# Altium footprint library AD_Connectors.PcbLib: 130 footprints (part 6 of 9)
Each footprint in its own frame and in the unit in brackets; x right, y up, seen from the top. Pads: shape width x height; smd on the part's side, far side on the other; paste and mask are expansions set on the pad; w line width, h text height; cw(c..) or ccw(c..) is an arc to the next point about the centre after c.
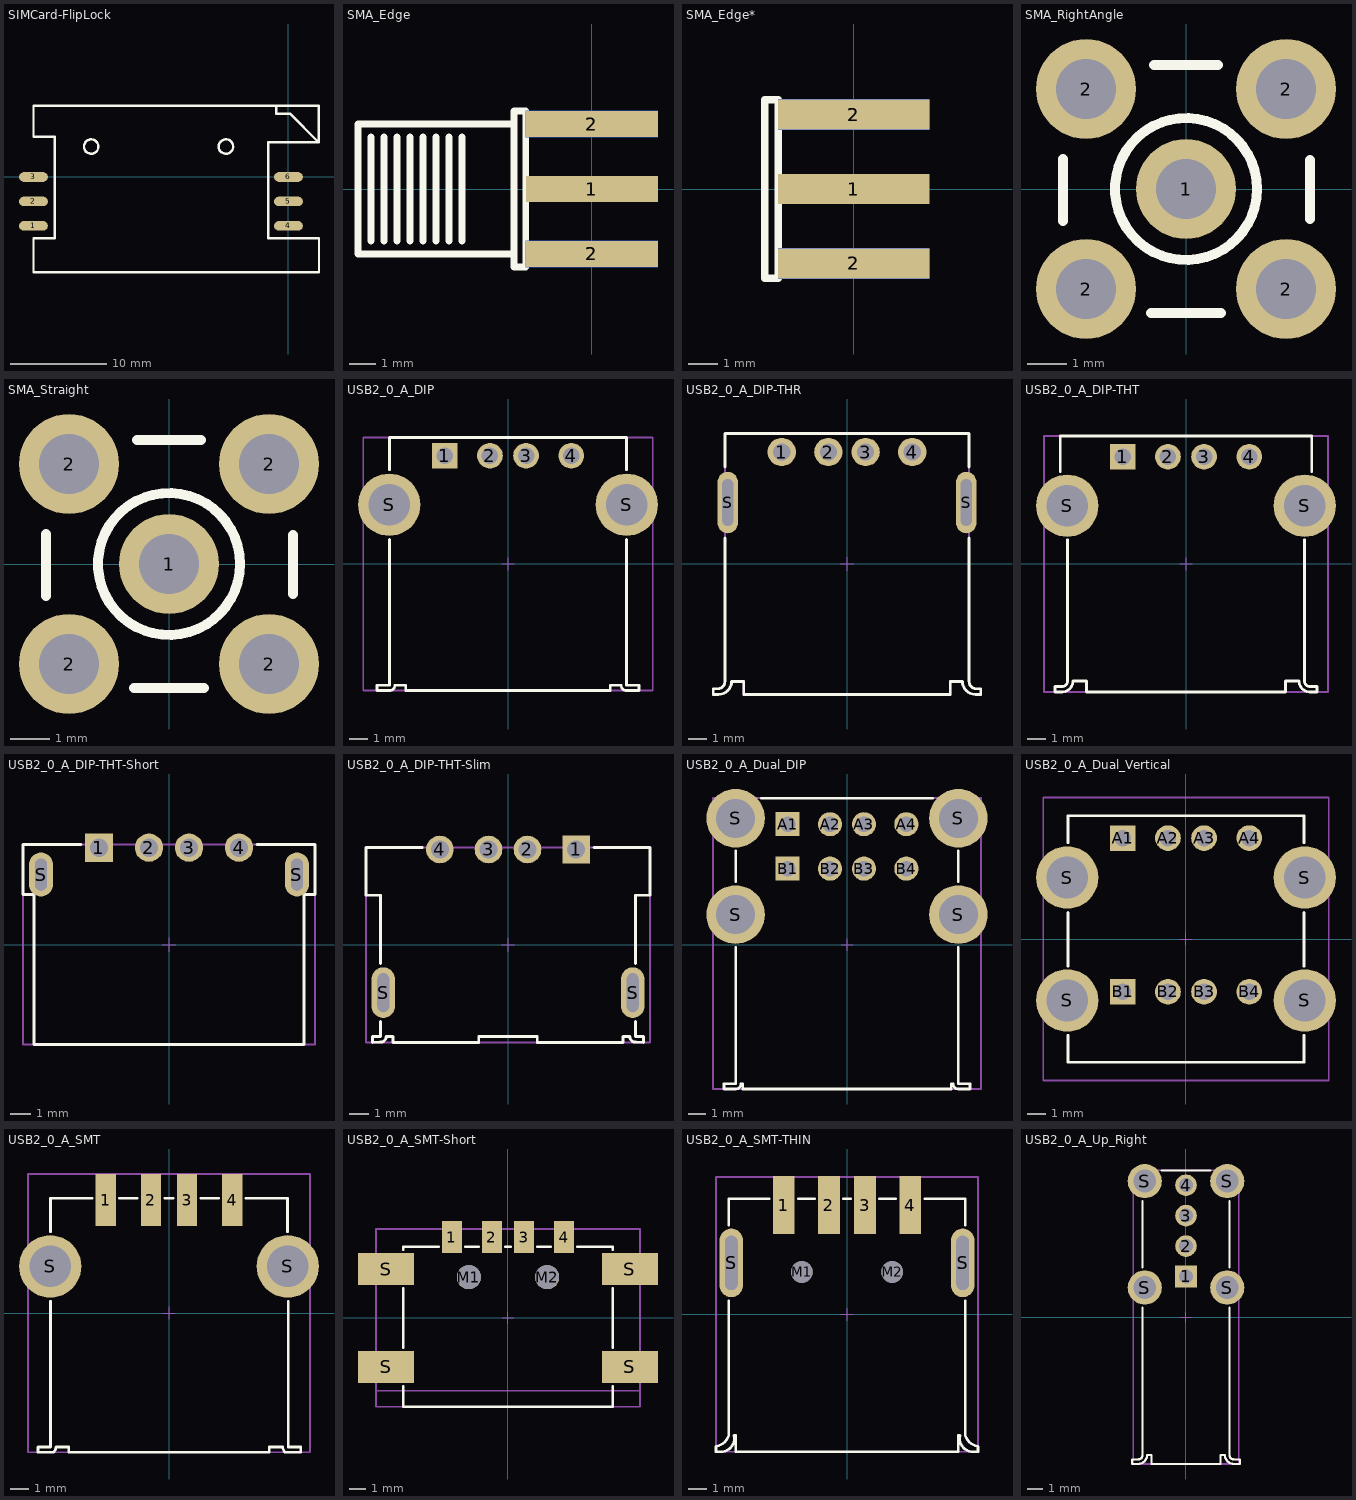
[diagram p5: the footprints below, top view; thin cyan lines are the x and y axes]

## SIMCard-FlipLock [mm]
height 2
pads (6):
  oval 3x1 smd: 1(-26.5,-5.08) 2(-26.5,-2.54) 3(-26.5,0) 4(0,-5.08) 5(0,-2.54) 6(0,0)
Top Overlay:
  circle w0.254: c-6.5,3.16 r0.75
  circle w0.254: c-20.5,3.16 r0.75
  lines w0.254: -26.492,7.366 -26.492,4.16 -24.282,4.16 -24.282,-6.39 -26.492,-6.39 -26.492,-9.89 3.175,-9.89 3.175,-6.39 -2.083,-6.39 -2.083,3.591 3.15,3.591 ; -26.492,7.391 -2.601,7.391 3.15,7.391 3.15,3.591 ; -1.25,7.391 -1.25,6.591 0.15,6.591 3.15,3.591
3D body "User Library-SIM5060-6-0-26-01-A.STEP": height 2.6, standoff -0.7, extent -26.48,-9.85 3.16,7.35

## SMA_Edge [mil] "SMA PCB Edge Mount"
pads (5):
  rect 200x40 smd: 1(0,0) 2(0,-98.43) 2(0,98.43)
  rect 200x40 smd far side: 2(0,-98.43) 2(0,98.43)
Top Overlay:
  lines w10: -334.65,-78.74 -334.65,78.74 ; -314.96,-78.74 -314.96,78.74 ; -295.28,-78.74 -295.28,78.74 ; -275.59,-78.74 -275.59,78.74 ; -255.91,-78.74 -255.91,78.74 ; -236.22,-78.74 -236.22,78.74 ; -216.54,-78.74 -216.54,-59.06 -216.54,78.74 ; -196.85,-78.74 -196.85,78.74 ; -118.11,-98.43 -354.33,-98.43 -354.33,98.43 -118.11,98.43 ; -118.11,-118.11 -100,-118.11 -100,118.11 -118.11,118.11 -118.11,-118.11
3D body "SMA PCB edge Mount.step": height 137.8, standoff -100.39, extent -477.95,-118.23 57.49,117.99

## SMA_Edge* [mil] "SMA PCB Edge Mount"
pads (5):
  rect 200x40 smd: 1(0,0) 2(0,-98.43) 2(0,98.43)
  rect 200x40 smd far side: 2(0,-98.43) 2(0,98.43)
Top Overlay:
  lines w10: -118.11,-118.11 -118.11,118.11 -100,118.11 -100,-118.11 -118.11,-118.11
3D body "SMA PCB edge Mount.step": height 137.8, standoff -100.39, extent -477.95,-118.23 57.49,117.99

## SMA_RightAngle [mil] "SMA PCB Mount Right Angle"
height 314.96
pads (5):
  round 100 hole 60: 1(0,0) 2(-100,-100) 2(-100,100) 2(100,-100) 2(100,100)
Top Overlay:
  circle w10: c0,0 r71
  lines w10: -123,-32 -123,30 ; -35,-124 35,-124 ; -32,124 32,124 ; 124,-30 124,29
3D body "Samtec-SMA-J-P-H-RA-TH1.STEP": height 403.94, standoff -151.37, extent -456.71,-137.79 137.78,137.8

## SMA_Straight [mil] "SMA PCB Mount Straight"
pads (5):
  round 100 hole 60: 1(0,0) 2(-100,-100) 2(-100,100) 2(100,-100) 2(100,100)
Top Overlay:
  circle w10: c0,0 r71
  lines w10: -123,-32 -123,30 ; -35,-124 35,-124 ; -32,124 32,124 ; 124,-30 124,29
3D body "3-1478979-0.stp": height 400, standoff -111.81, extent -124.99,-124.99 125,125

## USB2_0_A_DIP [mm] "USB 2.0 Type A Horizontal"
height 6.9
pads (6):
  rect 1.42x1.42 hole 0.92: 1(-3.5,5.99)
  round 1.42 hole 0.92: 2(-1,5.99) 3(1,5.99) 4(3.5,5.99)
  round 3.45 hole 2.3: S(-6.57,3.28) S(6.57,3.28)
Top Overlay:
  lines w0.15: -6.55,1.35 -6.55,-6.7 -7.25,-6.7 -7.25,-7 -6.56,-7 ccw(c-6.55,-6.7) -6.25,-6.7 -5.65,-6.7 -5.65,-7 5.65,-7 5.65,-6.7 6.25,-6.7 ccw(c6.55,-6.7) 6.56,-7 7.25,-7 7.25,-6.7 6.55,-6.7 6.55,1.35 ; -6.55,5.21 -6.55,7 6.55,7 6.55,5.21
Mechanical 1:
  text "PCB Thickness 1.6mm" at -3.15,-7.7 h0.76
Mechanical 13:
  lines w0.1: -8,-7 -8,7 8,7 8,-7 -8,-7
Mechanical 15:
  lines w0.05: -0.35,0 0.35,0 ; 0,-0.35 0,0.35
3D body "61400416021.stp": height 7.63, standoff -4.06, extent -7.999,-7 7.999,7

## USB2_0_A_DIP-THR [mm] "USB Type A Horizontal THR"
height 7.25
pads (6):
  round 1.52 hole 0.92: 1(-3.5,6.01) 2(-1,6.01) 3(1,6.01) 4(3.5,6.01)
  oval 1.1x3.3 hole 0.6 slot 2.5 at 90 deg: S(-6.4,3.3) S(6.4,3.3)
Top Overlay:
  lines w0.15: -6.972,-6.7 -7.175,-6.7 -7.175,-7 -6.895,-7 ccw(c-6.895,-6.3) -6.195,-6.3 -5.545,-6.3 -5.545,-7 5.545,-7 5.545,-6.3 6.195,-6.3 ccw(c6.895,-6.3) 6.895,-7 7.175,-7 7.175,-6.7 6.972,-6.7 ; -6.972,-6.699 ccw(c-6.95,-6.3) -6.55,-6.3 -6.55,1.4 ; -6.55,5.2 -6.55,7 6.55,7 6.55,5.2 ; 6.55,1.4 6.55,-6.3 ccw(c6.95,-6.3) 6.972,-6.699
Mechanical 13:
  lines w0.1: -6.972,-6.7 -7.175,-6.7 -7.175,-7 -6.895,-7 ccw(c-6.895,-6.3) -6.195,-6.3 -5.545,-6.3 -5.545,-7 5.545,-7 5.545,-6.3 6.195,-6.3 ccw(c6.895,-6.3) 6.895,-7 7.175,-7 7.175,-6.7 6.972,-6.7 ; -6.972,-6.699 ccw(c-6.95,-6.3) -6.55,-6.3 -6.55,7 6.55,7 6.55,-6.3 ccw(c6.95,-6.3) 6.972,-6.699
Mechanical 15:
  lines w0.05: -0.35,0 0.35,0 ; 0,-0.35 0,0.35
3D body "61410416021R.stp": height 7.5, standoff -2.19, extent -7.225,-7 7.225,7

## USB2_0_A_DIP-THT [mm] "USB 2.0 Type A Horizontal THT"
height 6.9
pads (6):
  rect 1.42x1.42 hole 0.92: 1(-3.5,5.935)
  round 1.42 hole 0.92: 2(-1,5.935) 3(1,5.935) 4(3.5,5.935)
  round 3.45 hole 2.3: S(-6.57,3.225) S(6.57,3.225)
Top Overlay:
  lines w0.15: -6.95,5.115 -6.95,7.075 6.95,7.075 6.95,5.115 ; -6.55,1.335 -6.55,-6.475 cw(c-6.85,-6.475) -6.85,-6.775 -7.25,-6.775 -7.25,-7.075 -6.85,-7.075 ccw(c-6.85,-6.475) -6.25,-6.475 -5.5,-6.475 -5.5,-7.075 5.5,-7.075 5.5,-6.475 6.25,-6.475 ccw(c6.85,-6.475) 6.85,-7.075 7.25,-7.075 7.25,-6.775 6.85,-6.775 cw(c6.85,-6.475) 6.55,-6.475 6.55,1.335
Mechanical 1:
  text "PCB Thickness 1.6mm" at -3.15,-7.7 h0.76
Mechanical 13:
  lines w0.1: -7.85,-7.075 -7.85,7.075 7.85,7.075 7.85,-7.075 -7.85,-7.075
Mechanical 15:
  lines w0.05: -0.35,0 0.35,0 ; 0,-0.35 0,0.35
3D body "614004190021.stp": height 7.7, standoff -3.7, extent -7.85,-7.075 7.85,7.075

## USB2_0_A_DIP-THT-Short [mm] "USB 2.0 Type A Horizontal THT Short Type"
height 5.72
pads (6):
  rect 1.42x1.42 hole 0.92: 1(-3.5,4.85)
  round 1.42 hole 0.92: 2(-1,4.85) 3(1,4.85) 4(3.5,4.85)
  oval 1.2x2.2 hole 0.6 slot 1.6 at 90 deg: S(-6.4,3.5) S(6.4,3.5)
Top Overlay:
  lines w0.15: -4.41,5 -7.3,5 -7.3,2.5 -6.75,2.5 -6.75,-5 6.75,-5 6.75,2.5 7.3,2.5 7.3,5 4.4,5
Mechanical 13:
  lines w0.1: -7.3,-5 7.3,-5 7.3,5 -7.3,5 -7.3,-5
Mechanical 15:
  lines w0.05: -0.35,0 0.35,0 ; 0,-0.35 0,0.35
3D body "614104190121.stp": height 5.94, standoff -1.77, extent -7.3,-5 7.3,5

## USB2_0_A_DIP-THT-Slim [mm] "USB 2.0 THT Type A Horizontal Slim Type"
height 6.82
pads (6):
  rect 1.42x1.42 hole 0.92: 1(3.5,4.9)
  round 1.42 hole 0.92: 2(1,4.9) 3(-1,4.9) 4(-3.5,4.9)
  oval 1.2x2.6 hole 0.6 slot 2 at 90 deg: S(-6.4,-2.45) S(6.4,-2.45)
Top Overlay:
  lines w0.15: -6.55,-3.93 -6.55,-4.69 -6.95,-4.69 -6.95,-5 -6.56,-4.99 ccw(c-6.55,-4.69) -6.25,-4.69 -5.9,-4.69 -5.9,-5 -1.5,-5 -1.5,-4.7 1.5,-4.7 1.5,-5 5.9,-5 5.9,-4.69 6.25,-4.69 ccw(c6.55,-4.69) 6.56,-4.99 6.95,-5 6.95,-4.69 6.55,-4.69 6.55,-3.93 ; -6.55,-0.96 -6.55,2.55 -7.3,2.55 -7.3,5 -4.4,5 ; 4.41,5 7.3,5 7.3,2.55 6.55,2.55 6.55,-0.96
Mechanical 13:
  lines w0.1: -7.3,-5 7.3,-5 7.3,5 -7.3,5 -7.3,-5
Mechanical 15:
  lines w0.05: -0.35,0 0.35,0 ; 0,-0.35 0,0.35
3D body "614104150121.stp": height 7.26, standoff -1.56, extent -7.3,-5 7.3,5

## USB2_0_A_Dual_DIP [mm] "USB 2.0 Type A Horizontal Dual Stacked"
height 15.34
pads (12):
  rect 1.42x1.42 hole 0.92: A1(-3.5,7.11) B1(-3.5,4.49)
  round 1.42 hole 0.92: A2(-1,7.11) A3(1,7.11) A4(3.5,7.11) B2(-1,4.49) B3(1,4.49) B4(3.5,4.49)
  round 3.45 hole 2.3: S(-6.57,1.78) S(-6.57,7.46) S(6.57,1.78) S(6.57,7.46)
Top Overlay:
  lines w0.15: -6.55,-0.14 -6.55,-8.2 -7.25,-8.2 -7.25,-8.5 -6.56,-8.5 ccw(c-6.55,-8.2) -6.25,-8.2 -6.15,-8.2 -6.15,-8.5 6.15,-8.5 6.15,-8.2 6.25,-8.2 ccw(c6.55,-8.2) 6.56,-8.5 7.25,-8.5 7.25,-8.2 6.55,-8.2 6.55,-0.14 ; -6.55,3.71 -6.55,5.54 ; -5.06,8.65 5.06,8.65 ; 6.55,3.71 6.55,5.54
Mechanical 13:
  lines w0.1: -7.9,-8.5 -7.9,8.65 7.9,8.65 7.9,-8.5 -7.9,-8.5
Mechanical 15:
  lines w0.05: -0.35,0 0.35,0 ; 0,-0.35 0,0.35
3D body "61400826021.stp": height 15.93, standoff -3.91, extent -7.912,-8.5 7.912,8.65

## USB2_0_A_Dual_Vertical [mm] "USB 2.0 Type A Vertical Dual"
height 16.7
pads (12):
  rect 1.42x1.42 hole 0.92: A1(-3.5,5.58) B1(-3.5,-2.92)
  round 1.42 hole 0.92: A2(-1,5.58) A3(1,5.58) A4(3.5,5.58) B2(-1,-2.92) B3(1,-2.92) B4(3.5,-2.92)
  round 3.45 hole 2.3: S(-6.57,-3.4) S(-6.57,3.4) S(6.57,-3.4) S(6.57,3.4)
Top Overlay:
  lines w0.15: -6.52,-5.33 -6.52,-6.82 6.52,-6.82 6.52,-5.33 ; -6.52,-1.5 -6.52,1.47 ; -6.52,5.33 -6.52,6.82 6.52,6.82 6.52,5.33 ; 6.52,-1.5 6.52,1.47
Mechanical 1:
  text "PCB Thickness 1.6mm" at -3.2,-8.5 h0.76
Mechanical 13:
  lines w0.1: -7.89,-7.82 -7.89,7.82 7.89,7.82 7.89,-7.82 -7.89,-7.82
Mechanical 15:
  lines w0.05: -0.35,0 0.35,0 ; 0,-0.35 0,0.35
3D body "614008235023.stp": height 17.7, standoff -3.35, extent -7.889,-7.82 7.889,7.82

## USB2_0_A_SMT [mm] "USB 2.0 SMT Type A Horizontal"
height 7.12
pads (6):
  rect 1.12x2.88 smd: 1(-3.5,6.25) 2(-1,6.25) 3(1,6.25) 4(3.5,6.25)
  round 3.45 hole 2.3: S(-6.57,2.58) S(6.57,2.58)
Top Overlay:
  lines w0.15: -6.55,0.66 -6.55,-7.4 -7.25,-7.4 -7.25,-7.7 -6.39,-7.7 ; -6.55,4.5 -6.55,6.35 -4.26,6.35 ; -6.388,-7.702 ccw(c-6.65,-7.4) -6.25,-7.4 -5.55,-7.4 -5.55,-7.7 5.55,-7.7 5.55,-7.4 6.29,-7.4 ccw(c6.69,-7.4) 6.428,-7.702 ; -2.75,6.35 -1.76,6.35 ; -0.24,6.35 0.24,6.35 ; 1.75,6.35 2.74,6.35 ; 4.26,6.35 6.55,6.35 6.55,4.5 ; 6.43,-7.7 7.29,-7.7 7.29,-7.4 6.59,-7.4 6.59,0.66
Mechanical 13:
  lines w0.1: -7.8,-7.7 7.8,-7.7 7.8,7.7 -7.8,7.7 -7.8,-7.7
Mechanical 15:
  lines w0.05: -0.35,0 0.35,0 ; 0,-0.35 0,0.35
3D body "62900416021.stp": height 7.81, standoff -3.89, extent -7.81,-7.7 7.81,7.705

## USB2_0_A_SMT-Short [mm] "USB 2.0 Type A Horizontal SMT Short Type"
height 6.3
pads (10):
  rect 1.25x2 smd: 1(-3.5,5.045) 2(-1,5.045) 3(1,5.045) 4(3.5,5.045)
  round 1.5 hole 1.5 unplated: M1(-2.45,2.545) M2(2.45,2.545)
  rect 3.5x2 smd: S(-7.625,-3.055) S(-7.625,3.045) S(7.625,-3.055) S(7.625,3.045)
Top Overlay:
  lines w0.15: -6.55,-4.255 -6.55,-5.555 6.55,-5.555 6.55,-4.255 ; -6.55,-1.855 -6.55,1.845 ; -6.55,4.245 -6.55,4.445 -4.32,4.445 ; -2.68,4.445 -1.82,4.445 ; -0.18,4.445 0.18,4.445 ; 1.82,4.445 2.68,4.445 ; 4.32,4.445 6.55,4.445 6.55,4.245 ; 6.55,-1.855 6.55,1.845
Mechanical 1:
  lines w0.1: -8.25,-4.555 8.25,-4.555
  text "PCB Edge" at -2,-4.155 h1
Mechanical 13:
  lines w0.1: -8.25,-5.555 -8.25,5.555 8.25,5.555 8.25,-5.555 -8.25,-5.555
Mechanical 15:
  lines w0.05: -0.35,0 0.35,0 ; 0,-0.35 0,0.35
3D body "629104190121.stp": height 6.37, standoff -0.1, extent -8.25,-5.555 8.25,5.554

## USB2_0_A_SMT-THIN [mm] "USB 2.0 Type A Horizontal SMT with pegs"
height 7
pads (8):
  rect 1.2x3.2 smd: 1(-3.5,6.05) 2(-1,6.05) 3(1,6.05) 4(3.5,6.05)
  round 1.2 hole 1.2 unplated: M1(-2.5,2.35) M2(2.5,2.35)
  oval 1.3x3.8 hole 0.7 slot 3 at 90 deg: S(-6.4,2.85) S(6.4,2.85)
Top Overlay:
  lines w0.15: -7.25,-7.308 -7.25,-7.6 -6.87,-7.599 ccw(c-6.983,-6.857) -6.25,-6.7 -6.15,-6.7 -6.15,-7.6 6.15,-7.6 6.15,-6.7 6.25,-6.7 ccw(c6.983,-6.857) 6.87,-7.599 7.25,-7.6 7.25,-7.308 ; -7.249,-7.308 ccw(c-7.39,-6.44) -6.55,-6.7 -6.55,0.76 ; -6.55,4.94 -6.55,6.4 -4.3,6.4 ; -2.7,6.4 -1.8,6.4 ; -0.2,6.4 0.2,6.4 ; 1.8,6.4 2.7,6.4 ; 4.3,6.4 6.55,6.4 6.55,4.94 ; 6.55,0.76 6.55,-6.7 ccw(c7.39,-6.44) 7.249,-7.308
Mechanical 1:
  text "PCB Thickness 1.6mm" at -3.15,-8.4 h0.76
Mechanical 13:
  lines w0.1: -7.25,-7.6 -7.25,7.6 7.25,7.6 7.25,-7.6 -7.25,-7.6
Mechanical 15:
  lines w0.05: -0.35,0 0.35,0 ; 0,-0.35 0,0.35
3D body "629104151021.stp": height 7.4, standoff -2.1, extent -7.25,-7.6 7.25,7.6

## USB2_0_A_Up_Right [mm] "USB 2.0 Type A Up Right"
height 14.5
pads (8):
  rect 1.42x1.42 hole 0.92: 1(0,2.68)
  round 1.42 hole 0.92: 2(0,4.68) 3(0,6.68) 4(0,8.68)
  round 2.25 hole 1.5: S(-2.71,1.95) S(-2.71,8.95) S(2.71,1.95) S(2.71,8.95)
Top Overlay:
  lines w0.15: -2.86,0.63 -2.86,-9.06 cw(c-3.15,-9.06) -3.15,-9.35 -3.55,-9.35 -3.55,-9.65 -3.15,-9.65 ccw(c-3.15,-9.06) -2.56,-9.06 -2.27,-9.06 -2.27,-9.65 2.27,-9.65 2.27,-9.06 2.56,-9.06 ccw(c3.15,-9.06) 3.15,-9.65 3.55,-9.65 3.55,-9.35 3.15,-9.35 cw(c3.15,-9.06) 2.86,-9.06 2.86,0.63 ; -2.86,3.27 -2.86,7.64 ; -1.59,9.65 1.59,9.65 ; 2.86,3.27 2.86,7.64
Mechanical 13:
  lines w0.1: -3.475,-9.65 -3.475,9.65 3.475,9.65 3.475,-9.65 -3.475,-9.65
Mechanical 15:
  lines w0.05: -0.35,0 0.35,0 ; 0,-0.35 0,0.35
3D body "614004134726.stp": height 14.51, standoff -3.8, extent -3.55,-9.65 3.55,9.65